# Altium integrated library ALTIUM-PHD_2_54_SMT_SOCKET_HEADER_6100XXXXX21-rev16c.IntLib: 215 symbols
Pins are listed as number, name and electrical type; pins without a type are passive.

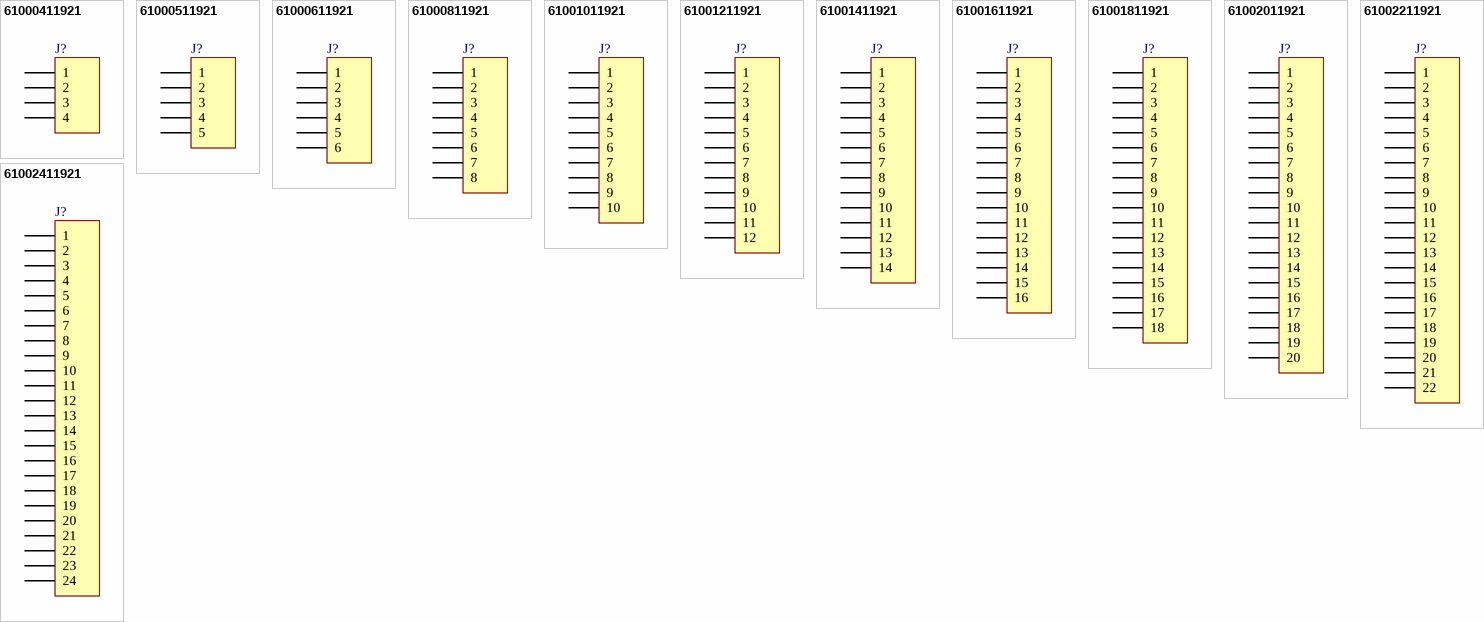
[diagram p0: symbols 61000411921 to 61002411921]

## 61000411921
designator J?, comment 04p  (value not drawn)
WR-PHD 2.54 mm SMT Socket Header, 04p; PartNumber: 61000411921; PublishedDate: July 2016; Publisher: Wurth Elektronik; ComponentLink1Description: Manufacturer; ComponentLink1URL: http://www.we-online.de; ComponentLink2Description: Datasheet; ComponentLink2URL: http://katalog.we-online.de/em/datasheet/6100xx11921.pdf; PinNumber: 04p
footprint 61000411921
pins: 1, 2, 3, 4

## 61000511921
designator J?, comment 05p  (value not drawn)
WR-PHD 2.54 mm SMT Socket Header, 05p; PartNumber: 61000511921; PublishedDate: July 2016; Publisher: Wurth Elektronik; ComponentLink1Description: Manufacturer; ComponentLink1URL: http://www.we-online.de; ComponentLink2Description: Datasheet; ComponentLink2URL: http://katalog.we-online.de/em/datasheet/6100xx11921.pdf; PinNumber: 05p
footprint 61000511921
pins: 1, 2, 3, 4, 5

## 61000611921
designator J?, comment 06p  (value not drawn)
WR-PHD 2.54 mm SMT Socket Header, 06p; PartNumber: 61000611921; PublishedDate: July 2016; Publisher: Wurth Elektronik; ComponentLink1Description: Manufacturer; ComponentLink1URL: http://www.we-online.de; ComponentLink2Description: Datasheet; ComponentLink2URL: http://katalog.we-online.de/em/datasheet/6100xx11921.pdf; PinNumber: 06p
footprint 61000611921
pins: 1, 2, 3, 4, 5, 6

## 61000811921
designator J?, comment 08p  (value not drawn)
WR-PHD 2.54 mm SMT Socket Header, 08p; PartNumber: 61000811921; PublishedDate: July 2016; Publisher: Wurth Elektronik; ComponentLink1Description: Manufacturer; ComponentLink1URL: http://www.we-online.de; ComponentLink2Description: Datasheet; ComponentLink2URL: http://katalog.we-online.de/em/datasheet/6100xx11921.pdf; PinNumber: 08p
footprint 61000811921
pins: 1, 2, 3, 4, 5, 6, 7, 8

## 61001011921
designator J?, comment 10p  (value not drawn)
WR-PHD 2.54 mm SMT Socket Header, 10p; PartNumber: 61001011921; PublishedDate: July 2016; Publisher: Wurth Elektronik; ComponentLink1Description: Manufacturer; ComponentLink1URL: http://www.we-online.de; ComponentLink2Description: Datasheet; ComponentLink2URL: http://katalog.we-online.de/em/datasheet/6100xx11921.pdf; PinNumber: 10p
footprint 61001011921
pins: 1, 2, 3, 4, 5, 6, 7, 8, 9, 10

## 61001211921
designator J?, comment 12p  (value not drawn)
WR-PHD 2.54 mm SMT Socket Header, 12p; PartNumber: 61001211921; PublishedDate: July 2016; Publisher: Wurth Elektronik; ComponentLink1Description: Manufacturer; ComponentLink1URL: http://www.we-online.de; ComponentLink2Description: Datasheet; ComponentLink2URL: http://katalog.we-online.de/em/datasheet/6100xx11921.pdf; PinNumber: 12p
footprint 61001211921
pins: 1, 2, 3, 4, 5, 6, 7, 8, 9, 10, 11, 12

## 61001411921
designator J?, comment 14p  (value not drawn)
WR-PHD 2.54 mm SMT Socket Header, 14p; PartNumber: 61001411921; PinNumber: 14; PublishedDate: July 2016; Publisher: Wurth Elektronik; ComponentLink1Description: Manufacturer; ComponentLink1URL: http://www.we-online.de; ComponentLink2Description: Datasheet; ComponentLink2URL: http://katalog.we-online.de/em/datasheet/6100xx11921.pdf
footprint 61001411921 (14 pins, 1 row, straight, Type 1, gold plating)
pins: 1, 2, 3, 4, 5, 6, 7, 8, 9, 10, 11, 12, 13, 14

## 61001611921
designator J?, comment 16p  (value not drawn)
WR-PHD 2.54 mm SMT Socket Header, 16p; PartNumber: 61001611921; PublishedDate: July 2016; Publisher: Wurth Elektronik; ComponentLink1Description: Manufacturer; ComponentLink1URL: http://www.we-online.de; ComponentLink2Description: Datasheet; ComponentLink2URL: http://katalog.we-online.de/em/datasheet/6100xx11921.pdf; PinNumber: 16p
footprint 61001611921 (16 pins, 1 row, straight, Type 1, gold plating)
pins: 1, 2, 3, 4, 5, 6, 7, 8, 9, 10, 11, 12, 13, 14, 15, 16

## 61001811921
designator J?, comment 18p  (value not drawn)
WR-PHD 2.54 mm SMT Socket Header, 18p; PartNumber: 61001811921; PublishedDate: July 2016; Publisher: Wurth Elektronik; ComponentLink1Description: Manufacturer; ComponentLink1URL: http://www.we-online.de; ComponentLink2Description: Datasheet; ComponentLink2URL: http://katalog.we-online.de/em/datasheet/6100xx11921.pdf; PinNumber: 18p
footprint 61001811921 (18 pins, 1 row, straight, Type 1, gold plating)
pins: 1, 2, 3, 4, 5, 6, 7, 8, 9, 10, 11, 12, 13, 14, 15, 16, 17, 18

## 61002011921
designator J?, comment 20p  (value not drawn)
WR-PHD 2.54 mm SMT Socket Header, 20p; PartNumber: 61002011921; PinNumber: 20; PublishedDate: July 2016; Publisher: Wurth Elektronik; ComponentLink1Description: Manufacturer; ComponentLink1URL: http://www.we-online.de; ComponentLink2Description: Datasheet; ComponentLink2URL: http://katalog.we-online.de/em/datasheet/6100xx11921.pdf
footprint 61002011921 (20 pins, 1 row, straight, Type 1, gold plating)
pins: 1, 2, 3, 4, 5, 6, 7, 8, 9, 10, 11, 12, 13, 14, 15, 16, 17, 18, 19, 20

## 61002211921
designator J?, comment 22p  (value not drawn)
WR-PHD 2.54 mm SMT Socket Header, 22p; PartNumber: 61002211921; PublishedDate: July 2016; Publisher: Wurth Elektronik; ComponentLink1Description: Manufacturer; ComponentLink1URL: http://www.we-online.de; ComponentLink2Description: Datasheet; ComponentLink2URL: http://katalog.we-online.de/em/datasheet/6100xx11921.pdf; PinNumber: 22p
footprint 61002211921 (22 pins, 1 row, straight, Type 1, gold plating)
pins: 1, 2, 3, 4, 5, 6, 7, 8, 9, 10, 11, 12, 13, 14, 15, 16, 17, 18, 19, 20, 21, 22

## 61002411921
designator J?, comment 24p  (value not drawn)
WR-PHD 2.54 mm SMT Socket Header, 24p; PartNumber: 61002411921; PublishedDate: July 2016; Publisher: Wurth Elektronik; ComponentLink1Description: Manufacturer; ComponentLink1URL: http://www.we-online.de; ComponentLink2Description: Datasheet; ComponentLink2URL: http://katalog.we-online.de/em/datasheet/6100xx11921.pdf; PinNumber: 24p
footprint 61002411921 (24 pins, 1 row, straight, Type 1, gold plating)
pins: 1, 2, 3, 4, 5, 6, 7, 8, 9, 10, 11, 12, 13, 14, 15, 16, 17, 18, 19, 20, 21, 22, 23, 24


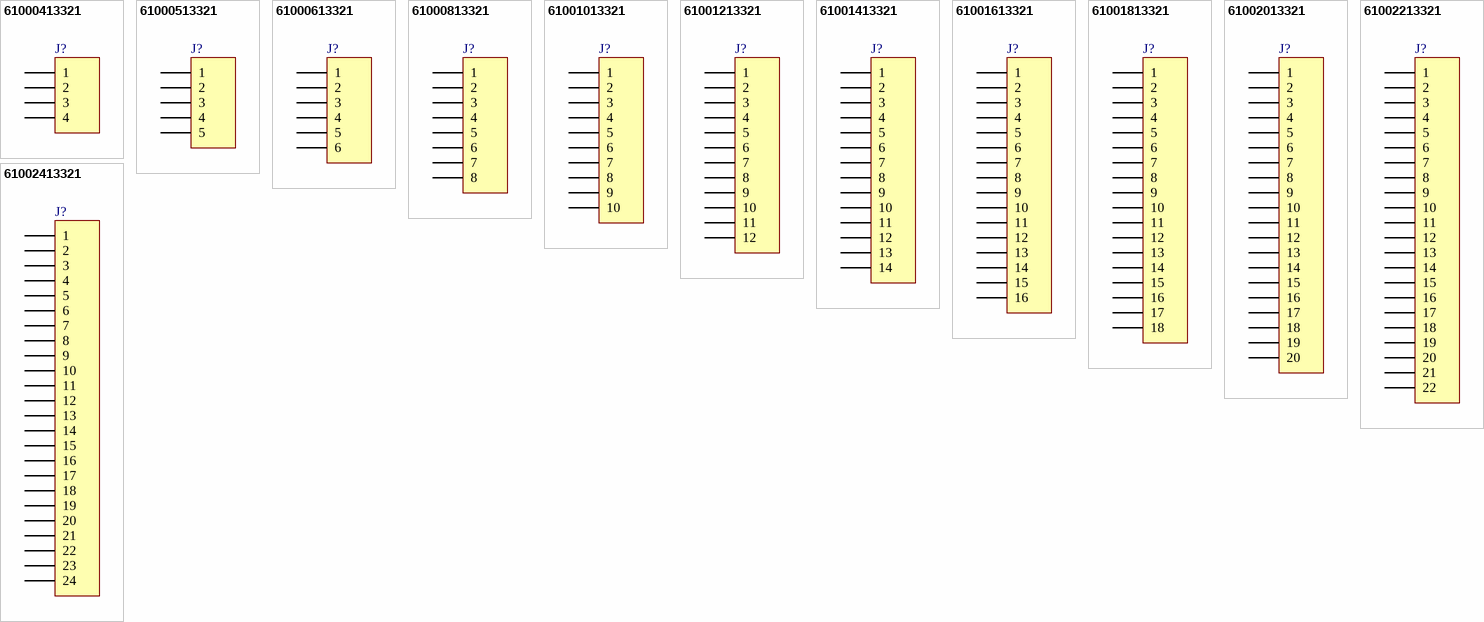
[diagram p1: symbols 61000413321 to 61002413321]

## 61000413321
designator J?, comment 04p  (value not drawn)
WR-PHD 2.54 mm SMT Socket Header, 04p; PartNumber: 61000413321; PublishedDate: July 2016; Publisher: Wurth Elektronik; ComponentLink1Description: Manufacturer; ComponentLink1URL: http://www.we-online.de; ComponentLink2Description: Datasheet; ComponentLink2URL: http://katalog.we-online.de/em/datasheet/6100xx13321.pdf; PinNumber: 04p
footprint 61000413321
pins: 1, 2, 3, 4

## 61000513321
designator J?, comment 05p  (value not drawn)
WR-PHD 2.54 mm SMT Socket Header, 05p; PartNumber: 61000513321; PublishedDate: July 2016; Publisher: Wurth Elektronik; ComponentLink1Description: Manufacturer; ComponentLink1URL: http://www.we-online.de; ComponentLink2Description: Datasheet; ComponentLink2URL: http://katalog.we-online.de/em/datasheet/6100xx13321.pdf; PinNumber: 05p
footprint 61000513321
pins: 1, 2, 3, 4, 5

## 61000613321
designator J?, comment 06p  (value not drawn)
WR-PHD 2.54 mm SMT Socket Header, 06p; PartNumber: 61000613321; PinNumber: 06; PublishedDate: July 2016; Publisher: Wurth Elektronik; ComponentLink1Description: Manufacturer; ComponentLink1URL: http://www.we-online.de; ComponentLink2Description: Datasheet; ComponentLink2URL: http://katalog.we-online.de/em/datasheet/6100xx13321.pdf
footprint 61000613321
pins: 1, 2, 3, 4, 5, 6

## 61000813321
designator J?, comment 08p  (value not drawn)
WR-PHD 2.54 mm SMT Socket Header, 08p; PartNumber: 61000813321; PinNumber: 08; PublishedDate: July 2016; Publisher: Wurth Elektronik; ComponentLink1Description: Manufacturer; ComponentLink1URL: http://www.we-online.de; ComponentLink2Description: Datasheet; ComponentLink2URL: http://katalog.we-online.de/em/datasheet/6100xx13321.pdf
footprint 61000813321
pins: 1, 2, 3, 4, 5, 6, 7, 8

## 61001013321
designator J?, comment 10p  (value not drawn)
WR-PHD 2.54 mm SMT Socket Header, 10p; PartNumber: 61001013321; PublishedDate: July 2016; Publisher: Wurth Elektronik; ComponentLink1Description: Manufacturer; ComponentLink1URL: http://www.we-online.de; ComponentLink2Description: Datasheet; ComponentLink2URL: http://katalog.we-online.de/em/datasheet/6100xx13321.pdf; PinNumber: 10p
footprint 61001013321
pins: 1, 2, 3, 4, 5, 6, 7, 8, 9, 10

## 61001213321
designator J?, comment 12p  (value not drawn)
WR-PHD 2.54 mm SMT Socket Header, 12p; PartNumber: 61001213321; PublishedDate: July 2016; Publisher: Wurth Elektronik; ComponentLink1Description: Manufacturer; ComponentLink1URL: http://www.we-online.de; ComponentLink2Description: Datasheet; ComponentLink2URL: http://katalog.we-online.de/em/datasheet/6100xx13321.pdf; PinNumber: 12p
footprint 61001213321
pins: 1, 2, 3, 4, 5, 6, 7, 8, 9, 10, 11, 12

## 61001413321
designator J?, comment 14p  (value not drawn)
WR-PHD 2.54 mm SMT Socket Header, 14p; PartNumber: 61001413321; PublishedDate: July 2016; Publisher: Wurth Elektronik; ComponentLink1Description: Manufacturer; ComponentLink1URL: http://www.we-online.de; ComponentLink2Description: Datasheet; ComponentLink2URL: http://katalog.we-online.de/em/datasheet/6100xx13321.pdf; PinNumber: 14p
footprint 61001413321
pins: 1, 2, 3, 4, 5, 6, 7, 8, 9, 10, 11, 12, 13, 14

## 61001613321
designator J?, comment 16p  (value not drawn)
WR-PHD 2.54 mm SMT Socket Header, 16p; PartNumber: 61001613321; PublishedDate: July 2016; Publisher: Wurth Elektronik; ComponentLink1Description: Manufacturer; ComponentLink1URL: http://www.we-online.de; ComponentLink2Description: Datasheet; ComponentLink2URL: http://katalog.we-online.de/em/datasheet/6100xx13321.pdf; PinNumber: 16p
footprint 61001613321
pins: 1, 2, 3, 4, 5, 6, 7, 8, 9, 10, 11, 12, 13, 14, 15, 16

## 61001813321
designator J?, comment 18p  (value not drawn)
WR-PHD 2.54 mm SMT Socket Header, 18p; PartNumber: 61001813321; PublishedDate: July 2016; Publisher: Wurth Elektronik; ComponentLink1Description: Manufacturer; ComponentLink1URL: http://www.we-online.de; ComponentLink2Description: Datasheet; ComponentLink2URL: http://katalog.we-online.de/em/datasheet/6100xx13321.pdf; PinNumber: 18p
footprint 61001813321
pins: 1, 2, 3, 4, 5, 6, 7, 8, 9, 10, 11, 12, 13, 14, 15, 16, 17, 18

## 61002013321
designator J?, comment 20p  (value not drawn)
WR-PHD 2.54 mm SMT Socket Header, 20p; PartNumber: 61002013321; PublishedDate: July 2016; Publisher: Wurth Elektronik; ComponentLink1Description: Manufacturer; ComponentLink1URL: http://www.we-online.de; ComponentLink2Description: Datasheet; ComponentLink2URL: http://katalog.we-online.de/em/datasheet/6100xx13321.pdf; PinNumber: 20p
footprint 61002013321
pins: 1, 2, 3, 4, 5, 6, 7, 8, 9, 10, 11, 12, 13, 14, 15, 16, 17, 18, 19, 20

## 61002213321
designator J?, comment 22p  (value not drawn)
WR-PHD 2.54 mm SMT Socket Header, 22p; PartNumber: 61002213321; PublishedDate: July 2016; Publisher: Wurth Elektronik; ComponentLink1Description: Manufacturer; ComponentLink1URL: http://www.we-online.de; ComponentLink2Description: Datasheet; ComponentLink2URL: http://katalog.we-online.de/em/datasheet/6100xx13321.pdf; PinNumber: 22p
footprint 61002213321
pins: 1, 2, 3, 4, 5, 6, 7, 8, 9, 10, 11, 12, 13, 14, 15, 16, 17, 18, 19, 20, 21, 22

## 61002413321
designator J?, comment 24p  (value not drawn)
WR-PHD 2.54 mm SMT Socket Header, 24p; PartNumber: 61002413321; PublishedDate: July 2016; Publisher: Wurth Elektronik; ComponentLink1Description: Manufacturer; ComponentLink1URL: http://www.we-online.de; ComponentLink2Description: Datasheet; ComponentLink2URL: http://katalog.we-online.de/em/datasheet/6100xx13321.pdf; PinNumber: 24p
footprint 61002413321
pins: 1, 2, 3, 4, 5, 6, 7, 8, 9, 10, 11, 12, 13, 14, 15, 16, 17, 18, 19, 20, 21, 22, 23, 24


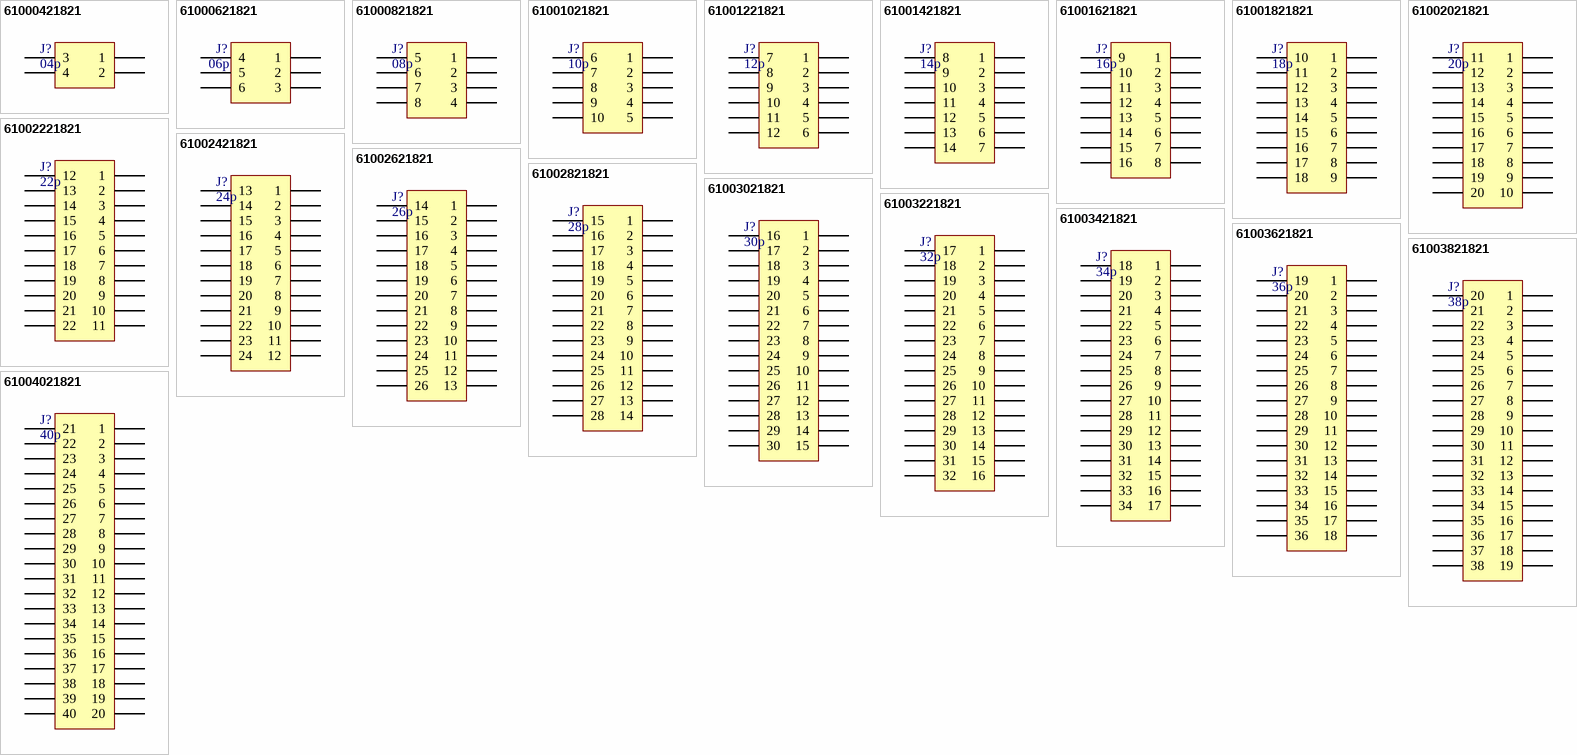
[diagram p2: symbols 61000421821 to 61004021821]

## 61000421821
designator J?, comment 04p
WR-PHD 2.54 mm Dual SMT Socket Header, 04p; PartNumber: 61000421821; PublishedDate: July 2016; Publisher: Wurth Elektronik; ComponentLink1Description: Manufacturer; ComponentLink1URL: http://www.we-online.de; ComponentLink2Description: Datasheet; ComponentLink2URL: http://katalog.we-online.de/em/datasheet/6100xx21821.pdf; PinNumber: 04p
footprint 61000421821
pins: 1, 2, 3, 4

## 61000621821
designator J?, comment 06p
WR-PHD 2.54 mm Dual SMT Socket Header, 06p; PartNumber: 61000621821; PublishedDate: July 2016; Publisher: Wurth Elektronik; ComponentLink1Description: Manufacturer; ComponentLink1URL: http://www.we-online.de; ComponentLink2Description: Datasheet; ComponentLink2URL: http://katalog.we-online.de/em/datasheet/6100xx21821.pdf; PinNumber: 06p
footprint 61000621821
pins: 1, 2, 3, 4, 5, 6

## 61000821821
designator J?, comment 08p
WR-PHD 2.54 mm Dual SMT Socket Header, 08p; PartNumber: 61000821821; PublishedDate: July 2016; Publisher: Wurth Elektronik; ComponentLink1Description: Manufacturer; ComponentLink1URL: http://www.we-online.de; ComponentLink2Description: Datasheet; ComponentLink2URL: http://katalog.we-online.de/em/datasheet/6100xx21821.pdf; PinNumber: 08p
footprint 61000821821
pins: 1, 2, 3, 4, 5, 6, 7, 8

## 61001021821
designator J?, comment 10p
WR-PHD 2.54 mm Dual SMT Socket Header, 10p; PartNumber: 61001021821; PublishedDate: July 2016; Publisher: Wurth Elektronik; ComponentLink1Description: Manufacturer; ComponentLink1URL: http://www.we-online.de; ComponentLink2Description: Datasheet; ComponentLink2URL: http://katalog.we-online.de/em/datasheet/6100xx21821.pdf; PinNumber: 10p
footprint 61001021821
pins: 1, 2, 3, 4, 5, 6, 7, 8, 9, 10

## 61001221821
designator J?, comment 12p
WR-PHD 2.54 mm Dual SMT Socket Header, 12p; PartNumber: 61001221821; PublishedDate: July 2016; Publisher: Wurth Elektronik; ComponentLink1Description: Manufacturer; ComponentLink1URL: http://www.we-online.de; ComponentLink2Description: Datasheet; ComponentLink2URL: http://katalog.we-online.de/em/datasheet/6100xx21821.pdf; PinNumber: 12p
footprint 61001221821
pins: 1, 2, 3, 4, 5, 6, 7, 8, 9, 10, 11, 12

## 61001421821
designator J?, comment 14p
WR-PHD 2.54 mm Dual SMT Socket Header, 14p; PartNumber: 61001421821; PublishedDate: July 2016; Publisher: Wurth Elektronik; ComponentLink1Description: Manufacturer; ComponentLink1URL: http://www.we-online.de; ComponentLink2Description: Datasheet; ComponentLink2URL: http://katalog.we-online.de/em/datasheet/6100xx21821.pdf; PinNumber: 14p
footprint 61001421821
pins: 1, 2, 3, 4, 5, 6, 7, 8, 9, 10, 11, 12, 13, 14

## 61001621821
designator J?, comment 16p
WR-PHD 2.54 mm Dual SMT Socket Header, 16p; PartNumber: 61001621821; PublishedDate: July 2016; Publisher: Wurth Elektronik; ComponentLink1Description: Manufacturer; ComponentLink1URL: http://www.we-online.de; ComponentLink2Description: Datasheet; ComponentLink2URL: http://katalog.we-online.de/em/datasheet/6100xx21821.pdf; PinNumber: 16p
footprint 61001621821
pins: 1, 2, 3, 4, 5, 6, 7, 8, 9, 10, 11, 12, 13, 14, 15, 16

## 61001821821
designator J?, comment 18p
WR-PHD 2.54 mm Dual SMT Socket Header, 18p; PartNumber: 61001821821; PublishedDate: July 2016; Publisher: Wurth Elektronik; ComponentLink1Description: Manufacturer; ComponentLink1URL: http://www.we-online.de; ComponentLink2Description: Datasheet; ComponentLink2URL: http://katalog.we-online.de/em/datasheet/6100xx21821.pdf; PinNumber: 18p
footprint 61001821821
pins: 1, 2, 3, 4, 5, 6, 7, 8, 9, 10, 11, 12, 13, 14, 15, 16, 17, 18

## 61002021821
designator J?, comment 20p
WR-PHD 2.54 mm Dual SMT Socket Header, 20p; PartNumber: 61002021821; PublishedDate: July 2016; Publisher: Wurth Elektronik; ComponentLink1Description: Manufacturer; ComponentLink1URL: http://www.we-online.de; ComponentLink2Description: Datasheet; ComponentLink2URL: http://katalog.we-online.de/em/datasheet/6100xx21821.pdf; PinNumber: 20p
footprint 61002021821
pins: 1, 2, 3, 4, 5, 6, 7, 8, 9, 10, 11, 12, 13, 14, 15, 16, 17, 18, 19, 20

## 61002221821
designator J?, comment 22p
WR-PHD 2.54 mm Dual SMT Socket Header, 22p; PartNumber: 61002221821; PublishedDate: July 2016; Publisher: Wurth Elektronik; ComponentLink1Description: Manufacturer; ComponentLink1URL: http://www.we-online.de; ComponentLink2Description: Datasheet; ComponentLink2URL: http://katalog.we-online.de/em/datasheet/6100xx21821.pdf; PinNumber: 22p
footprint 61002221821
pins: 1, 2, 3, 4, 5, 6, 7, 8, 9, 10, 11, 12, 13, 14, 15, 16, 17, 18, 19, 20, 21, 22

## 61002421821
designator J?, comment 24p
WR-PHD 2.54 mm Dual SMT Socket Header, 24p; PartNumber: 61002421821; PublishedDate: July 2016; Publisher: Wurth Elektronik; ComponentLink1Description: Manufacturer; ComponentLink1URL: http://www.we-online.de; ComponentLink2Description: Datasheet; ComponentLink2URL: http://katalog.we-online.de/em/datasheet/6100xx21821.pdf; PinNumber: 24p
footprint 61002421821
pins: 1, 2, 3, 4, 5, 6, 7, 8, 9, 10, 11, 12, 13, 14, 15, 16, 17, 18, 19, 20, 21, 22, 23, 24

## 61002621821
designator J?, comment 26p
WR-PHD 2.54 mm Dual SMT Socket Header, 26p; PartNumber: 61002621821; PublishedDate: July 2016; Publisher: Wurth Elektronik; ComponentLink1Description: Manufacturer; ComponentLink1URL: http://www.we-online.de; ComponentLink2Description: Datasheet; ComponentLink2URL: http://katalog.we-online.de/em/datasheet/6100xx21821.pdf; PinNumber: 26p
footprint 61002621821
pins: 1, 2, 3, 4, 5, 6, 7, 8, 9, 10, 11, 12, 13, 14, 15, 16, 17, 18, 19, 20, 21, 22, 23, 24, 25, 26

## 61002821821
designator J?, comment 28p
WR-PHD 2.54 mm Dual SMT Socket Header, 28p; PartNumber: 61002821821; PublishedDate: July 2016; Publisher: Wurth Elektronik; ComponentLink1Description: Manufacturer; ComponentLink1URL: http://www.we-online.de; ComponentLink2Description: Datasheet; ComponentLink2URL: http://katalog.we-online.de/em/datasheet/6100xx21821.pdf; PinNumber: 28p
footprint 61002821821
pins: 1, 2, 3, 4, 5, 6, 7, 8, 9, 10, 11, 12, 13, 14, 15, 16, 17, 18, 19, 20, 21, 22, 23, 24, 25, 26, 27, 28

## 61003021821
designator J?, comment 30p
WR-PHD 2.54 mm Dual SMT Socket Header, 30p; PartNumber: 61003021821; PublishedDate: July 2016; Publisher: Wurth Elektronik; ComponentLink1Description: Manufacturer; ComponentLink1URL: http://www.we-online.de; ComponentLink2Description: Datasheet; ComponentLink2URL: http://katalog.we-online.de/em/datasheet/6100xx21821.pdf; PinNumber: 30p
footprint 61003021821
pins: 1, 2, 3, 4, 5, 6, 7, 8, 9, 10, 11, 12, 13, 14, 15, 16, 17, 18, 19, 20, 21, 22, 23, 24, 25, 26, 27, 28, 29, 30

## 61003221821
designator J?, comment 32p
WR-PHD 2.54 mm Dual SMT Socket Header, 32p; PartNumber: 61003221821; PublishedDate: July 2016; Publisher: Wurth Elektronik; ComponentLink1Description: Manufacturer; ComponentLink1URL: http://www.we-online.de; ComponentLink2Description: Datasheet; ComponentLink2URL: http://katalog.we-online.de/em/datasheet/6100xx21821.pdf; PinNumber: 32p
footprint 61003221821
pins: 1, 2, 3, 4, 5, 6, 7, 8, 9, 10, 11, 12, 13, 14, 15, 16, 17, 18, 19, 20, 21, 22, 23, 24, 25, 26, 27, 28, 29, 30, 31, 32

## 61003421821
designator J?, comment 34p
WR-PHD 2.54 mm Dual SMT Socket Header, 34p; PartNumber: 61003421821; PublishedDate: July 2016; Publisher: Wurth Elektronik; ComponentLink1Description: Manufacturer; ComponentLink1URL: http://www.we-online.de; ComponentLink2Description: Datasheet; ComponentLink2URL: http://katalog.we-online.de/em/datasheet/6100xx21821.pdf; PinNumber: 34p
footprint 61003421821
pins: 1, 2, 3, 4, 5, 6, 7, 8, 9, 10, 11, 12, 13, 14, 15, 16, 17, 18, 19, 20, 21, 22, 23, 24, 25, 26, 27, 28, 29, 30, 31, 32, 33, 34

## 61003621821
designator J?, comment 36p
WR-PHD 2.54 mm Dual SMT Socket Header, 36p; PartNumber: 61003621821; PublishedDate: July 2016; Publisher: Wurth Elektronik; ComponentLink1Description: Manufacturer; ComponentLink1URL: http://www.we-online.de; ComponentLink2Description: Datasheet; ComponentLink2URL: http://katalog.we-online.de/em/datasheet/6100xx21821.pdf; PinNumber: 36p
footprint 61003621821
pins: 1, 2, 3, 4, 5, 6, 7, 8, 9, 10, 11, 12, 13, 14, 15, 16, 17, 18, 19, 20, 21, 22, 23, 24, 25, 26, 27, 28, 29, 30, 31, 32, 33, 34, 35, 36

## 61003821821
designator J?, comment 38p
WR-PHD 2.54 mm Dual SMT Socket Header, 38p; PartNumber: 61003821821; PublishedDate: July 2016; Publisher: Wurth Elektronik; ComponentLink1Description: Manufacturer; ComponentLink1URL: http://www.we-online.de; ComponentLink2Description: Datasheet; ComponentLink2URL: http://katalog.we-online.de/em/datasheet/6100xx21821.pdf; PinNumber: 38p
footprint 61003821821
pins: 1, 2, 3, 4, 5, 6, 7, 8, 9, 10, 11, 12, 13, 14, 15, 16, 17, 18, 19, 20, 21, 22, 23, 24, 25, 26, 27, 28, 29, 30, 31, 32, 33, 34, 35, 36, 37, 38

## 61004021821
designator J?, comment 40p
WR-PHD 2.54 mm Dual SMT Socket Header, 40p; PartNumber: 61004021821; PublishedDate: July 2016; Publisher: Wurth Elektronik; ComponentLink1Description: Manufacturer; ComponentLink1URL: http://www.we-online.de; ComponentLink2Description: Datasheet; ComponentLink2URL: http://katalog.we-online.de/em/datasheet/6100xx21821.pdf; PinNumber: 40p
footprint 61004021821
pins: 1, 2, 3, 4, 5, 6, 7, 8, 9, 10, 11, 12, 13, 14, 15, 16, 17, 18, 19, 20, 21, 22, 23, 24, 25, 26, 27, 28, 29, 30, 31, 32, 33, 34, 35, 36, 37, 38, 39, 40


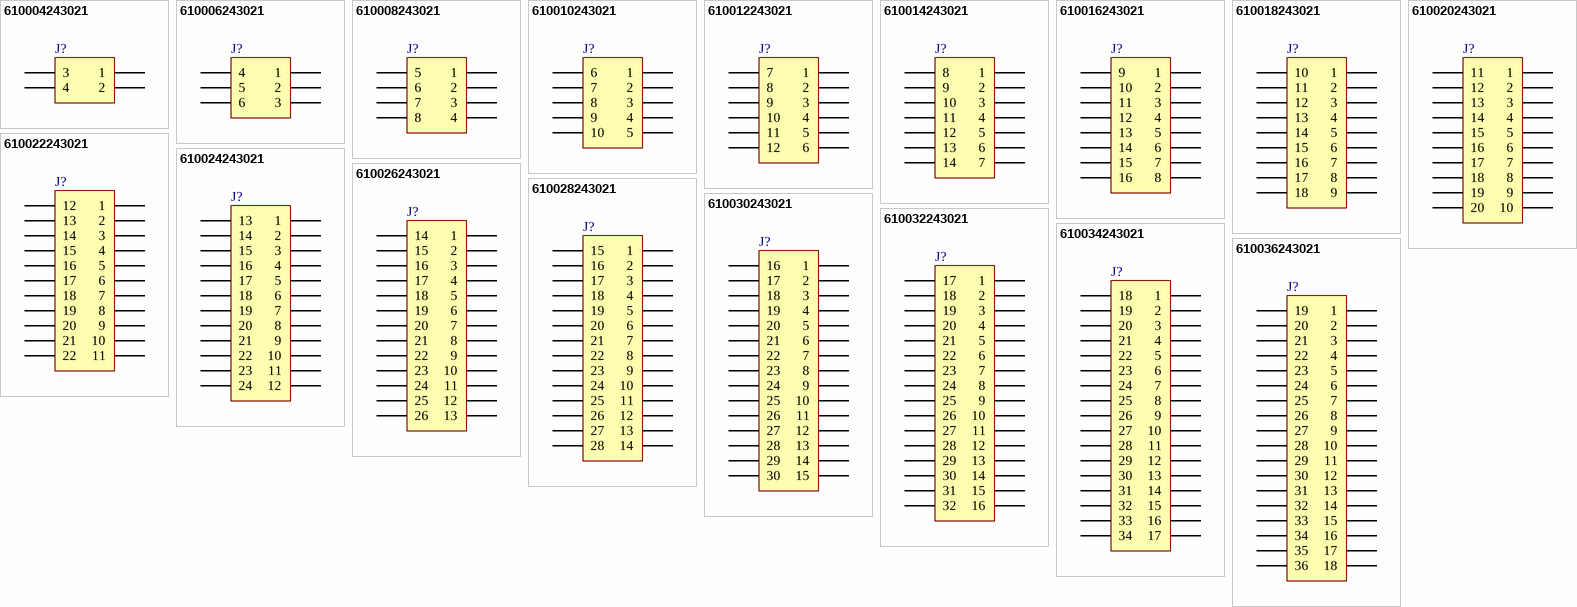
[diagram p3: symbols 610004243021 to 610036243021]

## 610004243021
designator J?, comment 04p  (value not drawn)
WR-PHD 2.54 mm SMT Dual Socket Header Bottom Entry, 04p; PartNumber: 610004243021; PublishedDate: July 2016; Publisher: Wurth Elektronik; ComponentLink1Description: Manufacturer; ComponentLink1URL: http://www.we-online.de; ComponentLink2Description: Datasheet; ComponentLink2URL: http://katalog.we-online.de/em/datasheet/6100xx243021.pdf; PinNumber: 04p
footprint 610004243021
pins: 1, 2, 3, 4

## 610006243021
designator J?, comment 06p  (value not drawn)
WR-PHD 2.54 mm SMT Dual Socket Header Bottom Entry, 06p; PartNumber: 610006243021; PublishedDate: July 2016; Publisher: Wurth Elektronik; ComponentLink1Description: Manufacturer; ComponentLink1URL: http://www.we-online.de; ComponentLink2Description: Datasheet; ComponentLink2URL: http://katalog.we-online.de/em/datasheet/6100xx243021.pdf; PinNumber: 06p
footprint 610006243021
pins: 1, 2, 3, 4, 5, 6

## 610008243021
designator J?, comment 08p  (value not drawn)
WR-PHD 2.54 mm SMT Dual Socket Header Bottom Entry, 08p; PartNumber: 610008243021; PublishedDate: July 2016; Publisher: Wurth Elektronik; ComponentLink1Description: Manufacturer; ComponentLink1URL: http://www.we-online.de; ComponentLink2Description: Datasheet; ComponentLink2URL: http://katalog.we-online.de/em/datasheet/6100xx243021.pdf; PinNumber: 08p
footprint 610008243021
pins: 1, 2, 3, 4, 5, 6, 7, 8

## 610010243021
designator J?, comment 10p  (value not drawn)
WR-PHD 2.54 mm SMT Dual Socket Header Bottom Entry, 10p; PartNumber: 610010243021; PublishedDate: July 2016; Publisher: Wurth Elektronik; ComponentLink1Description: Manufacturer; ComponentLink1URL: http://www.we-online.de; ComponentLink2Description: Datasheet; ComponentLink2URL: http://katalog.we-online.de/em/datasheet/6100xx243021.pdf; PinNumber: 10p
footprint 610010243021
pins: 1, 2, 3, 4, 5, 6, 7, 8, 9, 10

## 610012243021
designator J?, comment 12p  (value not drawn)
WR-PHD 2.54 mm SMT Dual Socket Header Bottom Entry, 12p; PartNumber: 610012243021; PublishedDate: July 2016; Publisher: Wurth Elektronik; ComponentLink1Description: Manufacturer; ComponentLink1URL: http://www.we-online.de; ComponentLink2Description: Datasheet; ComponentLink2URL: http://katalog.we-online.de/em/datasheet/6100xx243021.pdf; PinNumber: 12p
footprint 610012243021
pins: 1, 2, 3, 4, 5, 6, 7, 8, 9, 10, 11, 12

## 610014243021
designator J?, comment 14p  (value not drawn)
WR-PHD 2.54 mm SMT Dual Socket Header Bottom Entry, 14p; PartNumber: 610014243021; PublishedDate: July 2016; Publisher: Wurth Elektronik; ComponentLink1Description: Manufacturer; ComponentLink1URL: http://www.we-online.de; ComponentLink2Description: Datasheet; ComponentLink2URL: http://katalog.we-online.de/em/datasheet/6100xx243021.pdf; PinNumber: 14p
footprint 610014243021
pins: 1, 2, 3, 4, 5, 6, 7, 8, 9, 10, 11, 12, 13, 14

## 610016243021
designator J?, comment 16p  (value not drawn)
WR-PHD 2.54 mm SMT Dual Socket Header Bottom Entry, 16p; PartNumber: 610016243021; PublishedDate: July 2016; Publisher: Wurth Elektronik; ComponentLink1Description: Manufacturer; ComponentLink1URL: http://www.we-online.de; ComponentLink2Description: Datasheet; ComponentLink2URL: http://katalog.we-online.de/em/datasheet/6100xx243021.pdf; PinNumber: 16p
footprint 610016243021
pins: 1, 2, 3, 4, 5, 6, 7, 8, 9, 10, 11, 12, 13, 14, 15, 16

## 610018243021
designator J?, comment 18p  (value not drawn)
WR-PHD 2.54 mm SMT Dual Socket Header Bottom Entry, 18p; PartNumber: 610018243021; PublishedDate: July 2016; Publisher: Wurth Elektronik; ComponentLink1Description: Manufacturer; ComponentLink1URL: http://www.we-online.de; ComponentLink2Description: Datasheet; ComponentLink2URL: http://katalog.we-online.de/em/datasheet/6100xx243021.pdf; PinNumber: 18p
footprint 610018243021
pins: 1, 2, 3, 4, 5, 6, 7, 8, 9, 10, 11, 12, 13, 14, 15, 16, 17, 18

## 610020243021
designator J?, comment 20p  (value not drawn)
WR-PHD 2.54 mm SMT Dual Socket Header Bottom Entry, 20p; PartNumber: 610020243021; PublishedDate: July 2016; Publisher: Wurth Elektronik; ComponentLink1Description: Manufacturer; ComponentLink1URL: http://www.we-online.de; ComponentLink2Description: Datasheet; ComponentLink2URL: http://katalog.we-online.de/em/datasheet/6100xx243021.pdf; PinNumber: 20p
footprint 610020243021
pins: 1, 2, 3, 4, 5, 6, 7, 8, 9, 10, 11, 12, 13, 14, 15, 16, 17, 18, 19, 20

## 610022243021
designator J?, comment 22p  (value not drawn)
WR-PHD 2.54 mm SMT Dual Socket Header Bottom Entry, 22p; PartNumber: 610022243021; PublishedDate: July 2016; Publisher: Wurth Elektronik; ComponentLink1Description: Manufacturer; ComponentLink1URL: http://www.we-online.de; ComponentLink2Description: Datasheet; ComponentLink2URL: http://katalog.we-online.de/em/datasheet/6100xx243021.pdf; PinNumber: 22p
footprint 610022243021
pins: 1, 2, 3, 4, 5, 6, 7, 8, 9, 10, 11, 12, 13, 14, 15, 16, 17, 18, 19, 20, 21, 22

## 610024243021
designator J?, comment 24p  (value not drawn)
WR-PHD 2.54 mm SMT Dual Socket Header Bottom Entry, 24p; PartNumber: 610024243021; PublishedDate: July 2016; Publisher: Wurth Elektronik; ComponentLink1Description: Manufacturer; ComponentLink1URL: http://www.we-online.de; ComponentLink2Description: Datasheet; ComponentLink2URL: http://katalog.we-online.de/em/datasheet/6100xx243021.pdf; PinNumber: 24p
footprint 610024243021
pins: 1, 2, 3, 4, 5, 6, 7, 8, 9, 10, 11, 12, 13, 14, 15, 16, 17, 18, 19, 20, 21, 22, 23, 24
